# Altium footprint library rescap.PcbLib: 83 footprints (part 1 of 6)
Each footprint in its own frame and in the unit in brackets; x right, y up, seen from the top. Pads: shape width x height; smd on the part's side, far side on the other; paste and mask are expansions set on the pad; w line width, h text height; cw(c..) or ccw(c..) is an arc to the next point about the centre after c.
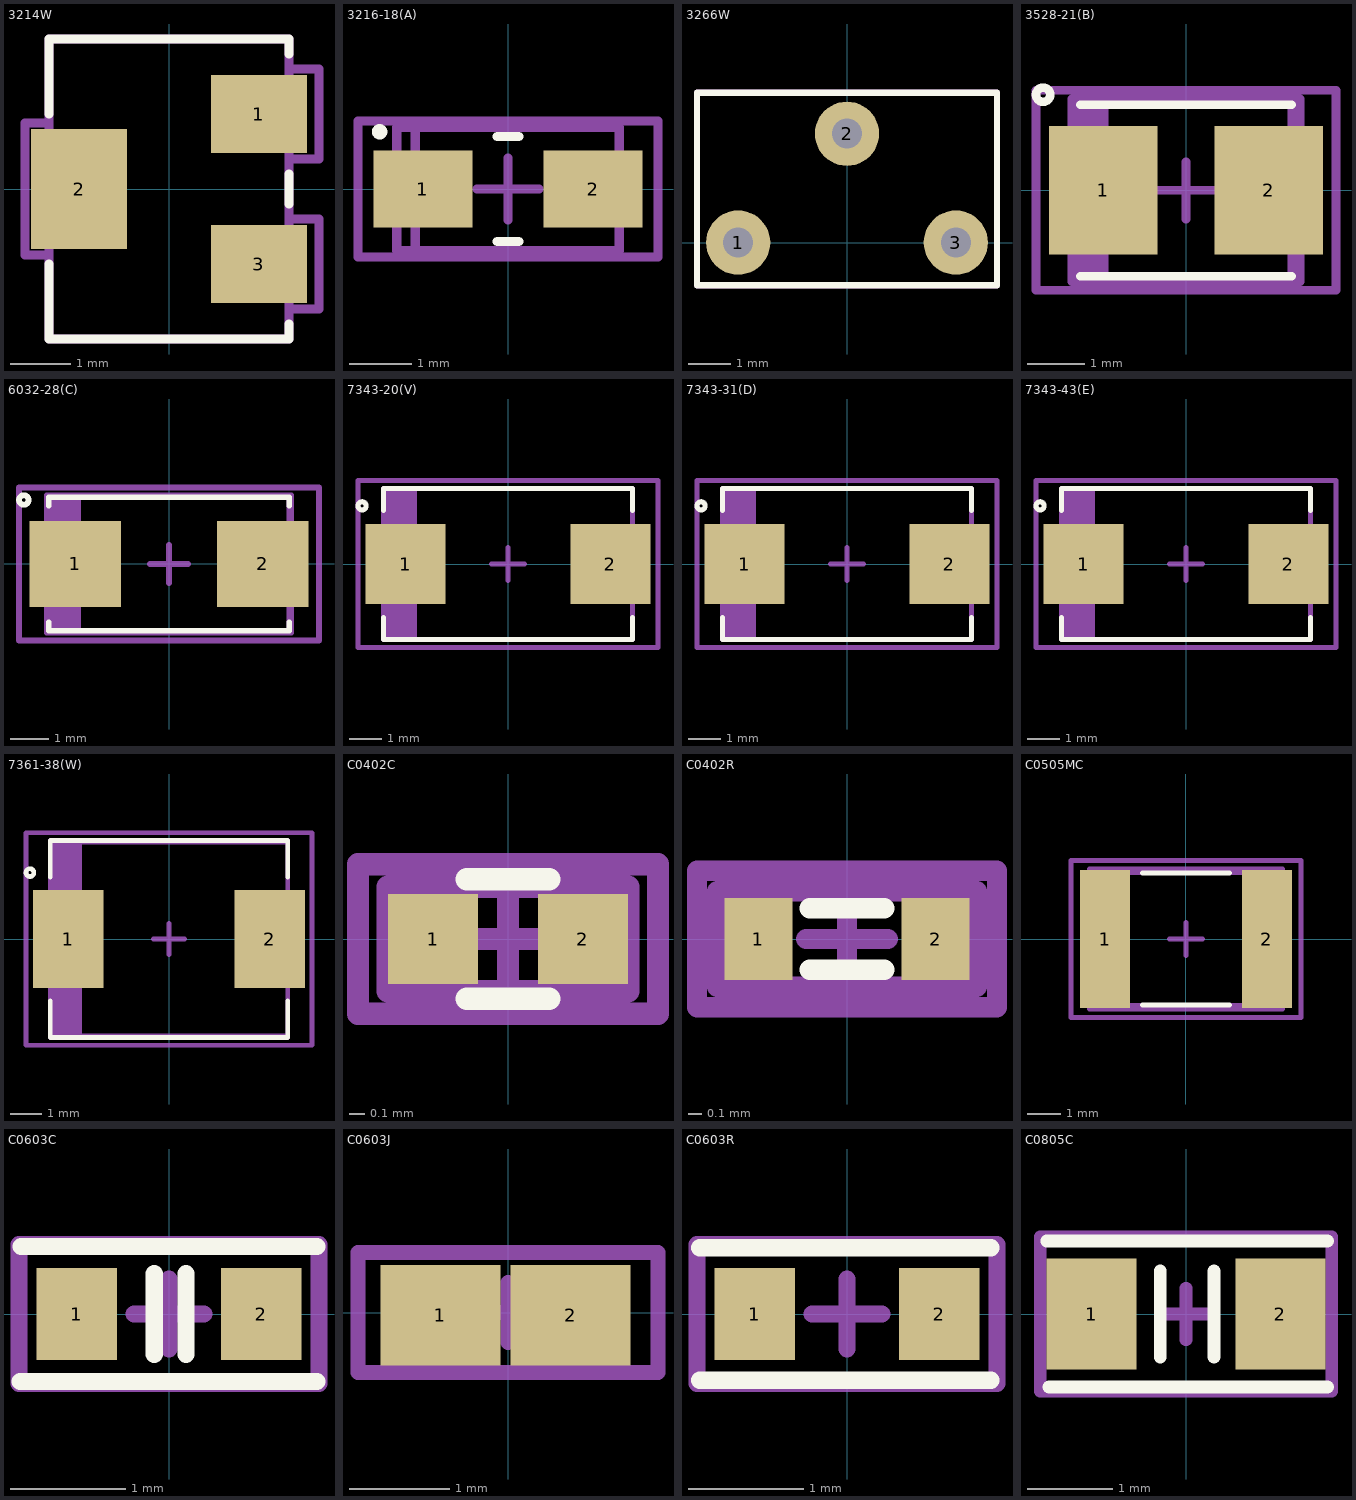
[diagram p0: the footprints below, top view; thin cyan lines are the x and y axes]

## 3214W [mm]
pads (3):
  rect 1.6x1.3 smd: 1(1.5,1.25) 3(1.5,-1.25)
  rect 1.6x2 smd: 2(-1.5,0)
Top Overlay:
  lines w0.15: -2,-1.25 -2,-2.5 2,-2.5 2,-2.25 ; -2,1.25 -2,2.5 2,2.5 2,2.25 ; 2,-0.25 2,0.25
Mechanical 29:
  lines w0.15: -2,-1.1 -2.4,-1.1 -2.4,1.1 -2,1.1 ; 2,-2 2.5,-2 2.5,-0.5 2,-0.5 ; 2,0.5 2.5,0.5 2.5,2 2,2 ; -2,-2.5 2,-2.5 2,2.5 -2,2.5 -2,-2.5
  text ".Designator" at -1.7,-0.3 h1
3D body "3214W.step": height 5.1, standoff -0.3, extent -1.97,-2.4 1.97,2.4

## 3216-18(A) [mm] "Molded Capacitor, 2-Leads, Body 3,20x1,60mm, IPC Medium Density"
height 1.6
pads (2):
  rect 1.6x1.25 smd: 1(-1.375,0) 2(1.375,0)
Top Overlay:
  circle w0.15: c-2.075,0.925 r0.05
  lines w0.15: -0.175,-0.85 0.175,-0.85 ; -0.175,0.85 0.175,0.85
Mechanical 15:
  lines w0.15: -0.5,0 0.5,0 ; 0,-0.5 0,0.5 ; -2.425,-1.1 -2.425,1.1 2.425,1.1 2.425,-1.1 -2.425,-1.1
Mechanical 29:
  lines w0.15: -1.5,-1 -1.5,1 -1.8,1 ; -1.8,1 1.8,1 1.8,-1 -1.8,-1 -1.8,1
  text ".Designator" at -1.3,-0.4 h1
3D body "3216-18(A).step": height 1.6, standoff 0, extent -1.82,-0.8 1.82,0.8

## 3266W [mm]
height 8
pads (3):
  round 1.5 hole 0.7: 1(-2.54,0) 2(0,2.54) 3(2.54,0)
Top Overlay:
  lines w0.15: -3.5,-1 -3.5,3.5 3.5,3.5 3.5,-1 -3.5,-1
Mechanical 29:
  lines w0.15: -3.5,-1 3.5,-1 3.5,3.5 -3.5,3.5 -3.5,-1
  text ".Designator" at -2.8,1.2 h1
3D body "User Library-POT-3266W.step": height 8.25, standoff -1.91, extent -3.378,-0.896 3.328,3.6

## 3528-21(B) [mm] "Molded Capacitor, 2-Leads, Body 3,60x2,90mm, IPC Medium Density"
height 2.1
pads (2):
  rect 1.9x2.25 smd: 1(-1.45,0) 2(1.45,0)
Top Overlay:
  circle w0.15: c-2.5,1.675 r0.125
  lines w0.15: -1.85,-1.5 1.85,-1.5 ; -1.85,1.5 1.85,1.5
Mechanical 15:
  lines w0.15: -0.5,0 0.5,0 ; 0,-0.5 0,0.5 ; -2.625,-1.75 -2.625,1.75 2.625,1.75 2.625,-1.75 -2.625,-1.75
Mechanical 29:
  rectangle: -1.85,-1.5 -1.352,1.5
  lines w0.15: -1.5,-1.6 -1.5,1.6 -2,1.6 ; -2,1.6 -2,-1.6 2,-1.6 2,1.6 -2,1.6 ; -1.85,-1.5 -1.85,1.5 1.85,1.5 1.85,-1.5 -1.85,-1.5
  text ".Designator" at -1,-0.4 h1
3D body "CAPMP3629X21N.step": height 2.1, standoff 0, extent -2.07,-1.5 2.07,1.5

## 6032-28(C) [mm] "Molded Capacitor, 2-Leads, Body 6,15x3,35mm, IPC Medium Density"
height 2.8
pads (2):
  rect 2.4x2.25 smd: 1(-2.45,0) 2(2.45,0)
Top Overlay:
  circle w0.15: c-3.8,1.675 r0.125
  lines w0.15: -3.15,-1.525 -3.15,-1.75 3.15,-1.75 3.15,-1.525 ; -3.15,1.525 -3.15,1.75 3.15,1.75 3.15,1.525
Mechanical 15:
  lines w0.15: -0.5,0 0.5,0 ; 0,-0.5 0,0.5 ; -3.925,-2 -3.925,2 3.925,2 3.925,-2 -3.925,-2
Mechanical 29:
  rectangle: -3.15,-1.75 -2.303,1.75
  lines w0.15: -2.4,-1.8 -2.4,1.8 -3.2,1.8 ; -3.2,1.8 -3.2,-1.8 3.2,-1.8 3.2,1.8 -3.2,1.8 ; -3.15,-1.75 -3.15,1.75 3.15,1.75 3.15,-1.75 -3.15,-1.75
  text ".Designator" at -2,-0.4 h1
3D body "CAPMP6134X28N.step": height 2.8, standoff 0, extent -3.37,-1.75 3.37,1.75

## 7343-20(V) [mm] "Molded Capacitor, 2-Leads, Body 7,45x4,45mm, IPC Medium Density"
height 2
pads (2):
  rect 2.45x2.45 smd: 1(-3.125,0) 2(3.125,0)
Top Overlay:
  circle w0.15: c-4.45,1.775 r0.125
  lines w0.15: -3.8,-1.625 -3.8,-2.3 3.8,-2.3 3.8,-1.625 ; -3.8,1.625 -3.8,2.3 3.8,2.3 3.8,1.625
Mechanical 15:
  lines w0.15: -0.5,0 0.5,0 ; 0,-0.5 0,0.5 ; -4.575,-2.55 -4.575,2.55 4.575,2.55 4.575,-2.55 -4.575,-2.55
Mechanical 29:
  rectangle: -3.8,-2.3 -2.778,2.3
  lines w0.15: -3,-2.3 -3,2.3 -3.8,2.3 ; -3.8,-2.3 -3.8,2.3 ; -3.8,-2.3 3.8,-2.3 ; -3.8,-2.3 -3.8,2.3 ; -3.8,-2.3 3.8,-2.3 ; -3.8,2.3 3.8,2.3 ; -3.8,2.3 3.8,2.3 ; 3.8,-2.3 3.8,2.3 ; 3.8,-2.3 3.8,2.3
  text ".Designator" at -2.6,-0.3 h1
3D body "CAPMP7444X20N.step": height 2, standoff 0, extent -4.02,-2.3 4.02,2.3

## 7343-31(D) [mm] "Molded Capacitor, 2-Leads, Body 7,45x4,45mm, IPC Medium Density"
height 3.1
pads (2):
  rect 2.45x2.45 smd: 1(-3.125,0) 2(3.125,0)
Top Overlay:
  circle w0.15: c-4.45,1.775 r0.125
  lines w0.15: -3.8,-1.625 -3.8,-2.3 3.8,-2.3 3.8,-1.625 ; -3.8,1.625 -3.8,2.3 3.8,2.3 3.8,1.625
Mechanical 15:
  lines w0.15: -0.5,0 0.5,0 ; 0,-0.5 0,0.5 ; -4.575,-2.55 4.575,-2.55 4.575,2.55 -4.575,2.55 -4.575,-2.55
Mechanical 29:
  rectangle: -3.8,-2.3 -2.778,2.3
  lines w0.15: -3.2,-2.3 -3.2,2.3 -3.8,2.3 ; -3.8,-2.3 3.8,-2.3 ; -3.8,-2.3 -3.8,2.3 ; -3.8,-2.3 -3.8,2.3 ; -3.8,-2.3 3.8,-2.3 ; -3.8,2.3 3.8,2.3 ; -3.8,2.3 3.8,2.3 ; 3.8,-2.3 3.8,2.3 ; 3.8,-2.3 3.8,2.3
  text ".Designator" at -2.5,-0.3 h1
3D body "CAPMP7444X31N.step": height 3.1, standoff 0, extent -4.02,-2.3 4.02,2.3

## 7343-43(E) [mm] "Molded Capacitor, 2-Leads, Body 7,45x4,45mm, IPC Medium Density"
height 4.3
pads (2):
  rect 2.45x2.45 smd: 1(-3.125,0) 2(3.125,0)
Top Overlay:
  circle w0.15: c-4.45,1.775 r0.125
  lines w0.15: -3.8,-1.625 -3.8,-2.3 3.8,-2.3 3.8,-1.625 ; -3.8,1.625 -3.8,2.3 3.8,2.3 3.8,1.625
Mechanical 15:
  lines w0.15: -0.5,0 0.5,0 ; 0,-0.5 0,0.5 ; -4.575,-2.55 4.575,-2.55 4.575,2.55 -4.575,2.55 -4.575,-2.55
Mechanical 29:
  rectangle: -3.8,-2.3 -2.778,2.3
  lines w0.15: -3,-2.3 -3,2.3 -3.8,2.3 ; -3.8,-2.3 3.8,-2.3 ; -3.8,-2.3 -3.8,2.3 ; -3.8,-2.3 3.8,-2.3 ; -3.8,-2.3 -3.8,2.3 ; -3.8,2.3 3.8,2.3 ; -3.8,2.3 3.8,2.3 ; 3.8,-2.3 3.8,2.3 ; 3.8,-2.3 3.8,2.3
  text ".Designator" at -2.5,-0.4 h1
3D body "CAPMP7444X43N.step": height 4.3, standoff 0, extent -4.02,-2.3 4.02,2.3

## 7361-38(W) [mm] "Molded Capacitor, 2-Leads, Body 7,45x6,15mm, IPC Medium Density"
height 3.8
pads (2):
  rect 2.25x3.15 smd: 1(-3.225,0) 2(3.225,0)
Top Overlay:
  circle w0.15: c-4.45,2.125 r0.125
  lines w0.15: -3.8,-1.975 -3.8,-3.15 3.8,-3.15 3.8,-1.975 ; -3.8,1.975 -3.8,3.15 3.8,3.15 3.8,1.975
Mechanical 15:
  lines w0.15: -0.5,0 0.5,0 ; 0,-0.5 0,0.5 ; -4.575,-3.4 -4.575,3.4 4.575,3.4 4.575,-3.4 -4.575,-3.4
Mechanical 29:
  rectangle: -3.8,-3.15 -2.778,3.15
  lines w0.15: -2.9,-3.1 -2.9,3.1 -3.8,3.1 ; -3.8,3.1 3.8,3.1 3.8,-3.1 -3.8,-3.1 -3.8,3.1 ; -3.8,-3.15 -3.8,3.15 3.8,3.15 3.8,-3.15 -3.8,-3.15
  text ".Designator" at -2.5,-0.2 h1
3D body "CAPMP7461X38N.step": height 3.8, standoff 0, extent -4.02,-3.15 4.02,3.15

## C0402C [mm]
pads (2):
  rect 0.6x0.6 smd: 1(-0.5,0) 2(0.5,0)
Top Overlay:
  lines w0.15: -0.275,-0.4 0.275,-0.4 ; -0.275,0.4 0.275,0.4
Mechanical 15:
  lines w0.15: -0.3,0 0.3,0 ; 0,-0.3 0,0.3 ; -1,-0.5 -1,0.5 1,0.5 1,-0.5 -1,-0.5
Mechanical 29:
  lines w0.15: -0.8,-0.35 0.8,-0.35 0.8,0.35 -0.8,0.35 -0.8,-0.35
3D body "0402C.STEP": height 0.36, standoff 0, extent -0.5,-0.265 0.5,0.265

## C0402R [mm]
pads (2):
  rect 0.5x0.6 smd: 1(-0.65,0) 2(0.65,0)
Top Overlay:
  lines w0.15: -0.275,-0.225 0.275,-0.225 ; -0.275,0.225 0.275,0.225
Mechanical 15:
  lines w0.15: -0.3,0 0.3,0 ; 0,-0.3 0,0.3 ; -1.1,-0.5 -1.1,0.5 1.1,0.5 1.1,-0.5 -1.1,-0.5
Mechanical 29:
  lines w0.15: -0.95,-0.35 0.95,-0.35 0.95,0.35 -0.95,0.35 -0.95,-0.35
  text ".Designator" at -1.1,0.6 h1
3D body "0402R.STEP": height 0.34, standoff 0, extent -0.52,-0.3 0.52,0.3

## C0505MC [mm] "5,5x4,0x3,8"
height 3.8
pads (2):
  rect 1.5x4.15 smd: 1(-2.425,0) 2(2.425,0)
Top Overlay:
  lines w0.15: -1.3,-1.975 1.3,-1.975 ; -1.3,1.975 1.3,1.975
Mechanical 15:
  lines w0.15: -0.5,0 0.5,0 ; 0,-0.5 0,0.5 ; -3.45,-2.35 3.45,-2.35 3.45,2.35 -3.45,2.35 -3.45,-2.35
Mechanical 29:
  lines w0.15: -2.9,-2.1 -2.9,2.1 2.9,2.1 2.9,-2.1 -2.9,-2.1 ; -2.75,-2 2.75,-2 2.75,2 -2.75,2 -2.75,-2
  text ".Designator" at -2.2,-0.4 h1
3D body "CAPC5540X38N.step": height 3.8, standoff 0, extent -2.75,-2 2.75,2

## C0603C [mm]
height 0.8
pads (2):
  rect 0.7x0.8 smd: 1(-0.8,0) 2(0.8,0)
Top Overlay:
  lines w0.15: -1.29,-0.584 1.282,-0.584 ; -1.283,0.584 1.282,0.584 ; -0.127,-0.35 -0.127,0.35 ; 0.148,-0.35 0.148,0.35
Mechanical 15:
  lines w0.15: -0.3,0 0.3,0 ; 0,-0.3 0,0.3 ; -1.3,-0.6 1.3,-0.6 1.3,0.6 -1.3,0.6 -1.3,-0.6
3D body: height 0.5, standoff 0, extent -0.8,-0.4 -0.4,0.4
3D body: height 0.5, standoff 0, extent -0.4,-0.4 0.4,0.4
3D body: height 0.5, standoff 0, extent 0.4,-0.4 0.8,0.4

## C0603J [mm]
pads (2):
  rect 1.2x1 smd: 1(-0.675,-0.025) 2(0.625,-0.025)
Mechanical 15:
  lines w0.15: -0.3,0 0.3,0 ; 0,-0.3 0,0.3 ; -1.5,-0.6 1.5,-0.6 1.5,0.6 -1.5,0.6 -1.5,-0.6
3D body: height 0.5, standoff 0, extent -0.8,-0.4 -0.4,0.4
3D body: height 0.5, standoff 0, extent -0.4,-0.4 0.4,0.4
3D body: height 0.5, standoff 0, extent 0.4,-0.4 0.8,0.4

## C0603R [mm]
height 0.45
pads (2):
  rect 0.7x0.8 smd: 1(-0.8,0) 2(0.8,0)
Top Overlay:
  lines w0.15: -1.277,-0.575 1.248,-0.575 ; -1.277,0.575 1.248,0.575
Mechanical 15:
  lines w0.15: -0.3,0 0.3,0 ; 0,-0.3 0,0.3 ; -1.3,-0.6 1.3,-0.6 1.3,0.6 -1.3,0.6 -1.3,-0.6
3D body: height 0.45, standoff 0, extent -0.7,-0.41 -0.5,0.41
3D body: height 0.45, standoff 0, extent 0.5,-0.41 0.7,0.41
3D body: height 0.45, standoff 0, extent -0.5,-0.41 0.5,0.41

## C0805C [mm]
height 1
pads (2):
  rect 1.05x1.3 smd: 1(-1.1,0) 2(1.1,0)
Top Overlay:
  lines w0.15: -1.625,0.85 1.65,0.85 ; -1.6,-0.85 1.65,-0.85 ; -0.3,-0.5 -0.3,0.5 ; 0.325,-0.5 0.325,0.5
Mechanical 15:
  lines w0.15: -0.3,0 0.3,0 ; 0,-0.3 0,0.3 ; -1.7,-0.9 -1.7,0.9 1.7,0.9 1.7,-0.9 -1.7,-0.9
3D body: height 0.8, standoff 0, extent -1,-0.6 -0.4,0.6
3D body: height 0.8, standoff 0, extent -0.4,-0.6 0.4,0.6
3D body: height 0.8, standoff 0, extent 0.4,-0.6 1,0.6